# Altium footprint library ICs.PcbLib: 31 footprints (part 1 of 2)
Each footprint in its own frame and in the unit in brackets; x right, y up, seen from the top. Pads: shape width x height; smd on the part's side, far side on the other; paste and mask are expansions set on the pad; w line width, h text height; cw(c..) or ccw(c..) is an arc to the next point about the centre after c.
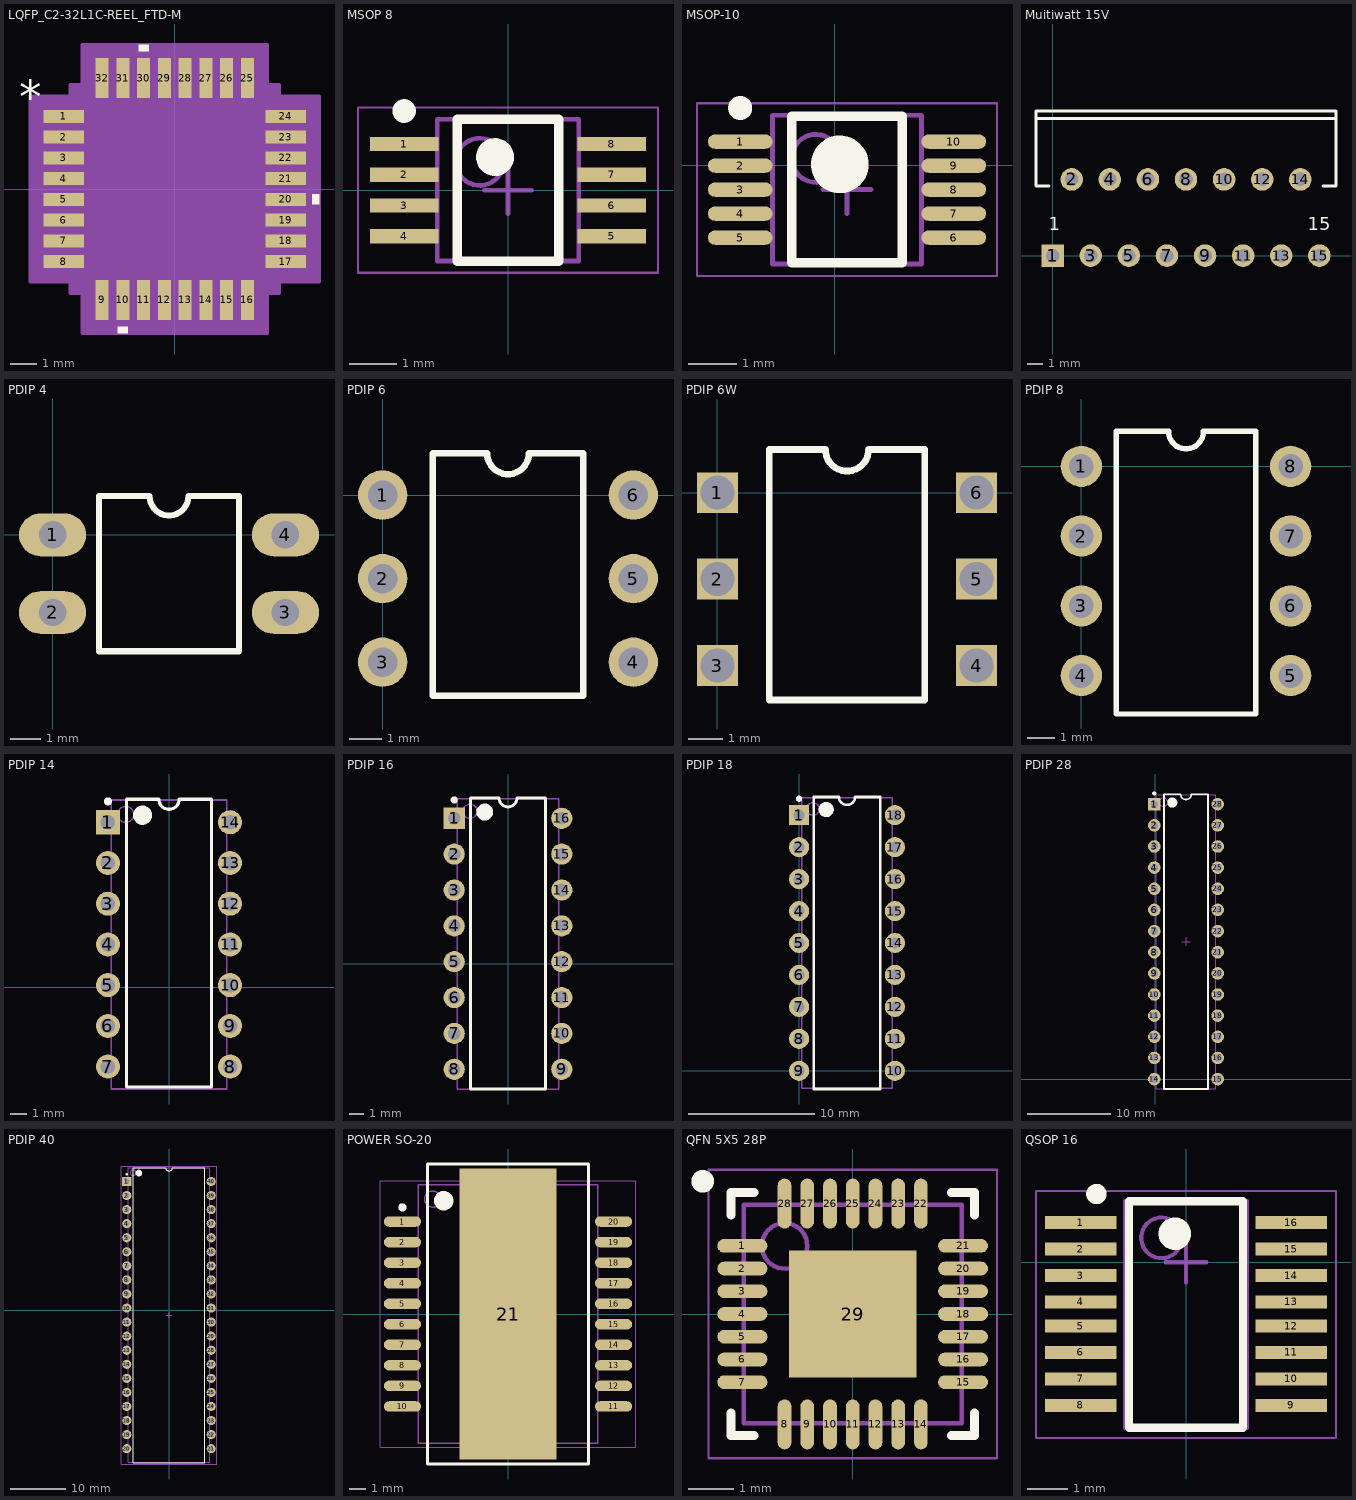
[diagram p0: the footprints below, top view; thin cyan lines are the x and y axes]

## LQFP_C2-32L1C-REEL_FTD-M [mil]
pads (32):
  rect 61x20 smd paste+0 mask+0: 1(-168.5,110.24) 2(-168.5,78.74) 3(-168.5,47.24) 4(-168.5,15.75) 5(-168.5,-15.75) 6(-168.5,-47.24) 7(-168.5,-78.74) 8(-168.5,-110.24) 17(168.5,-110.24) 18(168.5,-78.74) 19(168.5,-47.24) 20(168.5,-15.75) 21(168.5,15.75) 22(168.5,47.24) 23(168.5,78.74) 24(168.5,110.24)
  rect 20x61 smd paste+0 mask+0: 9(-110.24,-168.5) 10(-78.74,-168.5) 11(-47.24,-168.5) 12(-15.75,-168.5) 13(15.75,-168.5) 14(47.24,-168.5) 15(78.74,-168.5) 16(110.24,-168.5) 25(110.24,168.5) 26(78.74,168.5) 27(47.24,168.5) 28(15.75,168.5) 29(-15.75,168.5) 30(-47.24,168.5) 31(-78.74,168.5) 32(-110.24,168.5)
Top Overlay:
  region: -71.24,-209 -86.24,-209 -86.24,-219 -71.24,-219
  region: 209,-8.25 219,-8.25 219,-23.25 209,-23.25
  region: -39.74,209 -54.74,209 -54.74,219 -39.74,219
  text "*" at -236.5,115.98 h50
Mechanical 13:
  lines w1: -138,88 -88,138 ; -177,-119.24 -177,-101.24 -138,-101.24 -138,-119.24 -177,-119.24 ; -177,-87.74 -177,-69.74 -138,-69.74 -138,-87.74 -177,-87.74 ; -177,-56.24 -177,-38.24 -138,-38.24 -138,-56.24 -177,-56.24 ; -177,-24.75 -177,-6.75 -138,-6.75 -138,-24.75 -177,-24.75 ; -177,6.75 -177,24.75 -138,24.75 -138,6.75 -177,6.75 ; -177,38.24 -177,56.24 -138,56.24 -138,38.24 -177,38.24 ; -177,69.74 -177,87.74 -138,87.74 -138,69.74 -177,69.74 ; -177,101.24 -177,119.24 -138,119.24 -138,101.24 -177,101.24 ; -138,-138 -138,138 138,138 138,-138 -138,-138 ; -119.24,-177 -119.24,-138 -101.24,-138 -101.24,-177 -119.24,-177 ; -119.24,138 -101.24,138 -101.24,177 -119.24,177 -119.24,138 ; -87.74,-177 -87.74,-138 -69.74,-138 -69.74,-177 -87.74,-177 ; -87.74,138 -69.74,138 -69.74,177 -87.74,177 -87.74,138 ; -56.24,-177 -56.24,-138 -38.24,-138 -38.24,-177 -56.24,-177 ; -56.24,138 -38.24,138 -38.24,177 -56.24,177 -56.24,138 ; -24.75,-177 -24.75,-138 -6.75,-138 -6.75,-177 -24.75,-177 ; -24.75,138 -6.75,138 -6.75,177 -24.75,177 -24.75,138 ; 6.75,-177 6.75,-138 24.75,-138 24.75,-177 6.75,-177 ; 6.75,138 24.75,138 24.75,177 6.75,177 6.75,138 ; 38.24,-177 38.24,-138 56.24,-138 56.24,-177 38.24,-177 ; 38.24,138 56.24,138 56.24,177 38.24,177 38.24,138 ; 69.74,-177 69.74,-138 87.74,-138 87.74,-177 69.74,-177 ; 69.74,138 87.74,138 87.74,177 69.74,177 69.74,138 ; 101.24,-177 101.24,-138 119.24,-138 119.24,-177 101.24,-177 ; 101.24,138 119.24,138 119.24,177 101.24,177 101.24,138 ; 138,-119.24 138,-101.24 177,-101.24 177,-119.24 138,-119.24 ; 138,-87.74 138,-69.74 177,-69.74 177,-87.74 138,-87.74 ; 138,-56.24 138,-38.24 177,-38.24 177,-56.24 138,-56.24 ; 138,-24.75 138,-6.75 177,-6.75 177,-24.75 138,-24.75 ; 138,6.75 138,24.75 177,24.75 177,6.75 138,6.75 ; 138,38.24 138,56.24 177,56.24 177,38.24 138,38.24 ; 138,69.74 138,87.74 177,87.74 177,69.74 138,69.74 ; 138,101.24 138,119.24 177,119.24 177,101.24 138,101.24
  text "*" at -135.5,100.98 h50
Mechanical 15:
  region: -140.24,-158 -158,-158 -158,-140.24 -219,-140.24 -219,140.24 -158,140.24 -158,158 -140.24,158 -140.24,219 140.24,219 140.24,158 158,158 158,140.24 219,140.24 219,-140.24 158,-140.24 158,-158 140.24,-158 140.24,-219 -140.24,-219
  lines w6: -219,-140.24 -158,-140.24 -158,-158 -140.24,-158 -140.24,-219 140.24,-219 140.24,-158 158,-158 158,-140.24 219,-140.24 219,140.24 158,140.24 158,158 140.24,158 140.24,219 -140.24,219 -140.24,158 -158,158 -158,140.24 -219,140.24 -219,-140.24
3D body "LQFP_C2-32L1C-REEL_FTD.step": height 63.11, standoff 0, extent -177.01,-177.01 177.01,177.01

## MSOP 8 [mm]
height 2
pads (8):
  rect 1.45x0.3 smd: 1(-2.2,0.975) 2(-2.2,0.325) 3(-2.2,-0.325) 4(-2.2,-0.975) 5(2.2,-0.975) 6(2.2,-0.325) 7(2.2,0.325) 8(2.2,0.975)
Top Overlay:
  circle w0.25: c-2.2,1.675 r0.125
  circle w0.4: c-0.275,0.7 r0.2
  lines w0.2: -1.075,-1.5 -1.075,1.5 1.075,1.5 1.075,-1.5 -1.075,-1.5
Mechanical 13:
  circle w0.1: c-0.6,0.6 r0.5
  lines w0.1: -1.5,-1.5 -1.5,1.5 1.5,1.5 1.5,-1.5 -1.5,-1.5
Mechanical 15:
  lines w0.05: -3.175,-1.75 -3.175,1.75 3.175,1.75 3.175,-1.75 -3.175,-1.75
  lines w0.1: -0.5,0 0.5,0 ; 0,-0.5 0,0.5
3D body "MSOP-8 Natl Semi MUY08A.step": height 1.09, standoff -0.01, extent -2.5,-1.524 2.5,1.476

## MSOP-10 [mm] "TSSOP, 10-Leads, Body 3.00x3.05mm, Pitch 0.50mm, IPC Medium Density"
pads (10):
  oval 1.35x0.3 smd: 1(-1.971,0.492) 2(-1.971,-0.008) 3(-1.971,-0.508) 4(-1.971,-1.008) 5(-1.971,-1.508) 6(2.479,-1.508) 7(2.479,-1.008) 8(2.479,-0.508) 9(2.479,-0.008) 10(2.479,0.492)
Top Overlay:
  circle w0.6: c0.104,0.017 r0.3
  circle w0.25: c-1.971,1.192 r0.125
  lines w0.2: -0.896,-2.033 1.404,-2.033 1.404,1.017 -0.896,1.017 -0.896,-2.033
Mechanical 13:
  circle w0.1: c-0.396,0.142 r0.5
  lines w0.1: -1.296,-2.058 1.804,-2.058 1.804,1.042 -1.296,1.042 -1.296,-2.058
Mechanical 15:
  lines w0.05: -2.871,-2.308 3.379,-2.308 3.379,1.292 -2.871,1.292 -2.871,-2.308
  lines w0.1: -0.246,-0.508 0.754,-0.508 ; 0.254,-1.008 0.254,-0.008
3D body "MSOP-10.step": height 1.1, standoff 0, extent -2.196,-2.058 2.704,1.042

## Muitiwatt 15V [mm] "Power Multiwatt"
pads (15):
  rect 1.5x1.5 hole 0.9: 1(0,0)
  round 1.5 hole 0.9: 2(1.27,5.08) 3(2.54,0) 4(3.81,5.08) 5(5.08,0) 6(6.35,5.08) 7(7.62,0) 8(8.89,5.08) 9(10.16,0) 10(11.43,5.08) 11(12.7,0) 12(13.97,5.08) 13(15.24,0) 14(16.51,5.08) 15(17.78,0)
Top Overlay:
  lines w0.2: -1.11,9.13 18.89,9.13 ; -0.254,4.63 -1.11,4.63 -1.11,9.63 18.89,9.63 18.89,4.63 18.034,4.63
  text "15" at 17.018,1.397 h1.5
  text "1" at -0.254,1.397 h1.5
3D body "Multiwatt L298.step": height 20.9, standoff -1.4, extent -0.889,-0.373 18.711,9.517

## PDIP 4 [mm] "IC PDIP 4 PIN"
pads (4):
  oval 2.2x1.4 hole 0.9: 1(0,0) 2(0,-2.54) 3(7.62,-2.54) 4(7.62,0)
Top Overlay:
  lines w0.2: 1.524,-3.81 6.096,-3.81 6.096,1.27 4.445,1.27 cw(c3.81,1.27) 3.175,1.27 1.524,1.27 1.524,-3.81
3D body "PDIP 4.step": height 4.5, standoff -2.5, extent -0.13,-3.565 7.75,1.025

## PDIP 6 [mm] "PDIP 6P"
pads (6):
  round 1.5 hole 0.9: 1(0,0) 2(0,-2.54) 3(0,-5.08) 4(7.62,-5.08) 5(7.62,-2.54) 6(7.62,0)
Top Overlay:
  lines w0.2: 1.524,-6.096 6.096,-6.096 6.096,1.27 4.445,1.27 cw(c3.81,1.27) 3.175,1.27 1.524,1.27 1.524,-6.096
3D body "DIP6-White.STEP": height 5.3, standoff -2, extent -0.125,-6.104 7.745,1.016

## PDIP 6W [mm] "PDIP 6P WHITE"
pads (6):
  rect 1.2x1.2 hole 1: 1(0,0) 2(0,-2.54) 3(0,-5.08) 4(7.62,-5.08) 5(7.62,-2.54) 6(7.62,0)
Top Overlay:
  lines w0.2: 1.524,-6.096 1.524,1.27 3.175,1.27 ccw(c3.81,1.27) 4.445,1.27 6.096,1.27 6.096,-6.096 1.524,-6.096
3D body "DIP6-White.STEP": height 8.3, standoff 1, extent -0.125,-6.104 7.745,1.016
3D body "IC SOCKET 6 PIN.step": height 5.3, standoff -2.7, extent -1.27,-6.223 8.89,1.397

## PDIP 8 [mm] "PDIP 8P IC"
pads (8):
  round 1.5 hole 0.9: 1(0,0) 2(0,-2.54) 3(0,-5.08) 4(0,-7.62) 5(7.62,-7.62) 6(7.62,-5.08) 7(7.62,-2.54) 8(7.62,0)
Top Overlay:
  lines w0.2: 1.27,-9.017 6.35,-9.017 6.35,1.27 4.445,1.27 cw(c3.81,1.27) 3.175,1.27 1.27,1.27 1.27,-9.017
3D body "IC 8 DIP.step": height 8.86, standoff 1.5, extent -0.127,-8.382 7.743,1.018
3D body "IC SOCKET 8 PIN.step": height 5.5, standoff -2.5, extent -1.27,-8.89 8.89,1.27

## PDIP 14 [mm] "PDIP 14 2.54mm Pitch"
pads (14):
  rect 1.5x1.5 hole 0.9: 1(-3.81,10.287)
  round 1.5 hole 0.9: 2(-3.81,7.747) 3(-3.81,5.207) 4(-3.81,2.667) 5(-3.81,0.127) 6(-3.81,-2.413) 7(-3.81,-4.953) 8(3.81,-4.953) 9(3.81,-2.413) 10(3.81,0.127) 11(3.81,2.667) 12(3.81,5.207) 13(3.81,7.747) 14(3.81,10.287)
Top Overlay:
  circle w0.25: c-3.81,11.587 r0.125
  circle w0.6: c-1.65,10.727 r0.3
  lines w0.2: -2.65,-6.223 -2.65,11.727 -0.635,11.727 ccw(c0,11.727) 0.635,11.727 2.65,11.727 2.65,-6.223 -2.65,-6.223
Mechanical 13:
  circle w0.1: c-2.7,10.777 r0.5
  lines w0.1: -3.6,-6.35 -3.6,11.677 3.6,11.677 3.6,-6.35 -3.6,-6.35
3D body "DIP-14 N.step": height 7.1, standoff -0.25, extent -4.445,-6.083 4.692,11.417
3D body "IC SOCKET 14 PIN.step": height 4.7, standoff -3.3, extent -4.953,-6.223 5.207,11.557

## PDIP 16 [mm] "PDIP 16 2.54mm Pitch"
pads (16):
  rect 1.5x1.5 hole 0.9: 1(-3.81,10.287)
  round 1.5 hole 0.9: 2(-3.81,7.747) 3(-3.81,5.207) 4(-3.81,2.667) 5(-3.81,0.127) 6(-3.81,-2.413) 7(-3.81,-4.953) 8(-3.81,-7.493) 9(3.81,-7.493) 10(3.81,-4.953) 11(3.81,-2.413) 12(3.81,0.127) 13(3.81,2.667) 14(3.81,5.207) 15(3.81,7.747) 16(3.81,10.287)
Top Overlay:
  circle w0.25: c-3.81,11.587 r0.125
  circle w0.6: c-1.65,10.727 r0.3
  lines w0.2: -2.65,-8.89 -2.65,11.727 -0.635,11.727 ccw(c0,11.727) 0.635,11.727 2.65,11.727 2.65,-8.89 -2.65,-8.89
Mechanical 13:
  circle w0.1: c-2.7,10.777 r0.5
  lines w0.1: -3.6,-8.89 -3.6,11.677 3.6,11.677 3.6,-8.89 -3.6,-8.89
3D body "Socket IC 16P.step": height 5.5, standoff -2.5, extent -5.08,-8.763 5.08,11.557
3D body "DIP16.step": height 8.89, standoff 2.13, extent -4.064,-9.398 3.81,12.192

## PDIP 18 [mm] "IC PDIP 18"
pads (18):
  rect 1.6x1.6 hole 0.9: 1(0,20.32)
  round 1.6 hole 0.9: 2(0,17.78) 3(0,15.24) 4(0,12.7) 5(0,10.16) 6(0,7.62) 7(0,5.08) 8(0,2.54) 9(0,0) 10(7.62,0) 11(7.62,2.54) 12(7.62,5.08) 13(7.62,7.62) 14(7.62,10.16) 15(7.62,12.7) 16(7.62,15.24) 17(7.62,17.78) 18(7.62,20.32)
Top Overlay:
  circle w0.25: c0,21.62 r0.125
  circle w0.6: c2.16,20.76 r0.3
  lines w0.2: 1.16,-1.44 1.16,21.76 3.175,21.76 ccw(c3.81,21.76) 4.445,21.76 6.46,21.76 6.46,-1.44 1.16,-1.44
Mechanical 13:
  circle w0.1: c1.11,20.81 r0.5
  lines w0.1: 0.21,-1.39 0.21,21.71 7.41,21.71 7.41,-1.39 0.21,-1.39
3D body "IC SOCKET DIP 18.step": height 5.2, standoff -2.8, extent -1.27,-1.27 8.89,21.59
3D body "DIP18-1.STEP": height 8.57, standoff 0.19, extent -0.227,-1.333 7.593,21.907

## PDIP 28 [mm] "PDIP 28 Through Hole"
pads (28):
  rect 1.5x1.5 hole 0.9: 1(-0.127,33.02)
  round 1.5 hole 0.9: 2(-0.127,30.48) 3(-0.127,27.94) 4(-0.127,25.4) 5(-0.127,22.86) 6(-0.127,20.32) 7(-0.127,17.78) 8(-0.127,15.24) 9(-0.127,12.7) 10(-0.127,10.16) 11(-0.127,7.62) 12(-0.127,5.08) 13(-0.127,2.54) 14(-0.127,0) 15(7.493,0) 16(7.493,2.54) 17(7.493,5.08) 18(7.493,7.62) 19(7.493,10.16) 20(7.493,12.7) 21(7.493,15.24) 22(7.493,17.78) 23(7.493,20.32) 24(7.493,22.86) 25(7.493,25.4) 26(7.493,27.94) 27(7.493,30.48) 28(7.493,33.02)
Top Overlay:
  circle w0.6: c2.033,33.21 r0.3
  circle w0.25: c-0.127,34.32 r0.125
  lines w0.2: 1.033,-1.19 6.333,-1.19 6.333,34.21 4.318,34.21 cw(c3.683,34.21) 3.048,34.21 1.033,34.21 1.033,-1.19
Mechanical 13:
  circle w0.1: c0.983,33.26 r0.5
  lines w0.1: 0.083,-1.14 7.283,-1.14 7.283,34.16 0.083,34.16 0.083,-1.14
Mechanical 15:
  lines w0.1: 3.183,16.51 4.183,16.51 ; 3.683,16.01 3.683,17.01
3D body "28PDIP.step": height 4.65, standoff -1.57, extent -0.254,-1.461 7.62,34.481

## PDIP 40 [mm] "PDIP 40 IC Socket"
pads (40):
  rect 1.65x1.65 hole 0.9: 1(-7.62,23.241)
  round 1.65 hole 0.9: 2(-7.62,20.701) 3(-7.62,18.161) 4(-7.62,15.621) 5(-7.62,13.081) 6(-7.62,10.541) 7(-7.62,8.001) 8(-7.62,5.461) 9(-7.62,2.921) 10(-7.62,0.381) 11(-7.62,-2.159) 12(-7.62,-4.699) 13(-7.62,-7.239) 14(-7.62,-9.779) 15(-7.62,-12.319) 16(-7.62,-14.859) 17(-7.62,-17.399) 18(-7.62,-19.939) 19(-7.62,-22.479) 20(-7.62,-25.019) 21(7.62,-25.019) 22(7.62,-22.479) 23(7.62,-19.939) 24(7.62,-17.399) 25(7.62,-14.859) 26(7.62,-12.319) 27(7.62,-9.779) 28(7.62,-7.239) 29(7.62,-4.699) 30(7.62,-2.159) 31(7.62,0.381) 32(7.62,2.921) 33(7.62,5.461) 34(7.62,8.001) 35(7.62,10.541) 36(7.62,13.081) 37(7.62,15.621) 38(7.62,18.161) 39(7.62,20.701) 40(7.62,23.241)
Top Overlay:
  circle w0.6: c-5.45,24.761 r0.3
  circle w0.25: c-7.62,24.541 r0.125
  lines w0.2: -6.45,-27.539 6.45,-27.539 6.45,25.761 0.635,25.761 cw(c0,25.761) -0.635,25.761 -6.45,25.761 -6.45,-27.539
Mechanical 13:
  circle w0.1: c-6.475,24.811 r0.5
  lines w0.1: -7.375,-27.489 7.375,-27.489 7.375,25.711 -7.375,25.711 -7.375,-27.489
Mechanical 15:
  lines w0.05: -8.65,-27.789 8.65,-27.789 8.65,26.011 -8.65,26.011 -8.65,-27.789
  lines w0.1: -0.5,-0.889 0.5,-0.889 ; 0,-1.389 0,-0.389
3D body "40 PDIP SOCKET.STEP": height 4.47, standoff -2.9, extent -8.85,-26.289 8.85,24.511
3D body: height 0, standoff -1.6, extent 7.485,22.881 7.755,23.601
3D body: height 3.51, standoff 3.23, extent 7.375,22.741 7.755,23.741
3D body: height 3.24, standoff 0, extent 7.485,22.741 7.755,23.741
3D body: height 0, standoff -1.6, extent 7.485,20.341 7.755,21.061
3D body: height 3.51, standoff 3.23, extent 7.375,20.201 7.755,21.201
3D body: height 3.24, standoff 0, extent 7.485,20.201 7.755,21.201
3D body: height 0, standoff -1.6, extent 7.485,17.801 7.755,18.521
3D body: height 3.51, standoff 3.23, extent 7.375,17.661 7.755,18.661
3D body: height 3.24, standoff 0, extent 7.485,17.661 7.755,18.661
3D body: height 0, standoff -1.6, extent 7.485,15.261 7.755,15.981
3D body: height 3.51, standoff 3.23, extent 7.375,15.121 7.755,16.121
3D body: height 3.24, standoff 0, extent 7.485,15.121 7.755,16.121
3D body: height 0, standoff -1.6, extent 7.485,12.721 7.755,13.441
3D body: height 3.51, standoff 3.23, extent 7.375,12.581 7.755,13.581
3D body: height 3.24, standoff 0, extent 7.485,12.581 7.755,13.581
3D body: height 0, standoff -1.6, extent 7.485,10.181 7.755,10.901
3D body: height 3.51, standoff 3.23, extent 7.375,10.041 7.755,11.041
3D body: height 3.24, standoff 0, extent 7.485,10.041 7.755,11.041
3D body: height 0, standoff -1.6, extent 7.485,7.641 7.755,8.361
3D body: height 3.51, standoff 3.23, extent 7.375,7.501 7.755,8.501
3D body: height 3.24, standoff 0, extent 7.485,7.501 7.755,8.501
3D body: height 0, standoff -1.6, extent 7.485,5.101 7.755,5.821
3D body: height 3.51, standoff 3.23, extent 7.375,4.961 7.755,5.961
3D body: height 3.24, standoff 0, extent 7.485,4.961 7.755,5.961
3D body: height 0, standoff -1.6, extent 7.485,2.561 7.755,3.281
3D body: height 3.51, standoff 3.23, extent 7.375,2.421 7.755,3.421
3D body: height 3.24, standoff 0, extent 7.485,2.421 7.755,3.421
3D body: height 0, standoff -1.6, extent 7.485,0.021 7.755,0.741
3D body: height 3.51, standoff 3.23, extent 7.375,-0.119 7.755,0.881
3D body: height 3.24, standoff 0, extent 7.485,-0.119 7.755,0.881
3D body: height 0, standoff -1.6, extent 7.485,-2.519 7.755,-1.799
3D body: height 3.51, standoff 3.23, extent 7.375,-2.659 7.755,-1.659
3D body: height 3.24, standoff 0, extent 7.485,-2.659 7.755,-1.659
3D body: height 0, standoff -1.6, extent 7.485,-5.059 7.755,-4.339
3D body: height 3.51, standoff 3.23, extent 7.375,-5.199 7.755,-4.199
3D body: height 3.24, standoff 0, extent 7.485,-5.199 7.755,-4.199
3D body: height 0, standoff -1.6, extent 7.485,-7.599 7.755,-6.879
3D body: height 3.51, standoff 3.23, extent 7.375,-7.739 7.755,-6.739
3D body: height 3.24, standoff 0, extent 7.485,-7.739 7.755,-6.739
3D body: height 0, standoff -1.6, extent 7.485,-10.139 7.755,-9.419
3D body: height 3.51, standoff 3.23, extent 7.375,-10.279 7.755,-9.279
3D body: height 3.24, standoff 0, extent 7.485,-10.279 7.755,-9.279
3D body: height 0, standoff -1.6, extent 7.485,-12.679 7.755,-11.959
3D body: height 3.51, standoff 3.23, extent 7.375,-12.819 7.755,-11.819
3D body: height 3.24, standoff 0, extent 7.485,-12.819 7.755,-11.819
3D body: height 0, standoff -1.6, extent 7.485,-15.219 7.755,-14.499
3D body: height 3.51, standoff 3.23, extent 7.375,-15.359 7.755,-14.359
3D body: height 3.24, standoff 0, extent 7.485,-15.359 7.755,-14.359
3D body: height 0, standoff -1.6, extent 7.485,-17.759 7.755,-17.039
3D body: height 3.51, standoff 3.23, extent 7.375,-17.899 7.755,-16.899
3D body: height 3.24, standoff 0, extent 7.485,-17.899 7.755,-16.899
3D body: height 0, standoff -1.6, extent 7.485,-20.299 7.755,-19.579
3D body: height 3.51, standoff 3.23, extent 7.375,-20.439 7.755,-19.439
3D body: height 3.24, standoff 0, extent 7.485,-20.439 7.755,-19.439
3D body: height 0, standoff -1.6, extent 7.485,-22.839 7.755,-22.119
3D body: height 3.51, standoff 3.23, extent 7.375,-22.979 7.755,-21.979
3D body: height 3.24, standoff 0, extent 7.485,-22.979 7.755,-21.979
3D body: height 0, standoff -1.6, extent 7.485,-25.379 7.755,-24.659
3D body: height 3.51, standoff 3.23, extent 7.375,-25.519 7.755,-24.519
3D body: height 3.24, standoff 0, extent 7.485,-25.519 7.755,-24.519
3D body: height 0, standoff -1.6, extent -7.755,-25.379 -7.485,-24.659
3D body: height 3.51, standoff 3.23, extent -7.755,-25.519 -7.375,-24.519
3D body: height 3.24, standoff 0, extent -7.755,-25.519 -7.485,-24.519
3D body: height 0, standoff -1.6, extent -7.755,-22.839 -7.485,-22.119
3D body: height 3.51, standoff 3.23, extent -7.755,-22.979 -7.375,-21.979
3D body: height 3.24, standoff 0, extent -7.755,-22.979 -7.485,-21.979
3D body: height 0, standoff -1.6, extent -7.755,-20.299 -7.485,-19.579
3D body: height 3.51, standoff 3.23, extent -7.755,-20.439 -7.375,-19.439
3D body: height 3.24, standoff 0, extent -7.755,-20.439 -7.485,-19.439
3D body: height 0, standoff -1.6, extent -7.755,-17.759 -7.485,-17.039
3D body: height 3.51, standoff 3.23, extent -7.755,-17.899 -7.375,-16.899
3D body: height 3.24, standoff 0, extent -7.755,-17.899 -7.485,-16.899
3D body: height 0, standoff -1.6, extent -7.755,-15.219 -7.485,-14.499
3D body: height 3.51, standoff 3.23, extent -7.755,-15.359 -7.375,-14.359
3D body: height 3.24, standoff 0, extent -7.755,-15.359 -7.485,-14.359
3D body: height 0, standoff -1.6, extent -7.755,-12.679 -7.485,-11.959
3D body: height 3.51, standoff 3.23, extent -7.755,-12.819 -7.375,-11.819
3D body: height 3.24, standoff 0, extent -7.755,-12.819 -7.485,-11.819
3D body: height 0, standoff -1.6, extent -7.755,-10.139 -7.485,-9.419
3D body: height 3.51, standoff 3.23, extent -7.755,-10.279 -7.375,-9.279
3D body: height 3.24, standoff 0, extent -7.755,-10.279 -7.485,-9.279
3D body: height 0, standoff -1.6, extent -7.755,-7.599 -7.485,-6.879
3D body: height 3.51, standoff 3.23, extent -7.755,-7.739 -7.375,-6.739
3D body: height 3.24, standoff 0, extent -7.755,-7.739 -7.485,-6.739
3D body: height 0, standoff -1.6, extent -7.755,-5.059 -7.485,-4.339
3D body: height 3.51, standoff 3.23, extent -7.755,-5.199 -7.375,-4.199
3D body: height 3.24, standoff 0, extent -7.755,-5.199 -7.485,-4.199
3D body: height 0, standoff -1.6, extent -7.755,-2.519 -7.485,-1.799
3D body: height 3.51, standoff 3.23, extent -7.755,-2.659 -7.375,-1.659
3D body: height 3.24, standoff 0, extent -7.755,-2.659 -7.485,-1.659
3D body: height 0, standoff -1.6, extent -7.755,0.021 -7.485,0.741
3D body: height 3.51, standoff 3.23, extent -7.755,-0.119 -7.375,0.881
3D body: height 3.24, standoff 0, extent -7.755,-0.119 -7.485,0.881
3D body: height 0, standoff -1.6, extent -7.755,2.561 -7.485,3.281
3D body: height 3.51, standoff 3.23, extent -7.755,2.421 -7.375,3.421
3D body: height 3.24, standoff 0, extent -7.755,2.421 -7.485,3.421
3D body: height 0, standoff -1.6, extent -7.755,5.101 -7.485,5.821
3D body: height 3.51, standoff 3.23, extent -7.755,4.961 -7.375,5.961
3D body: height 3.24, standoff 0, extent -7.755,4.961 -7.485,5.961
3D body: height 0, standoff -1.6, extent -7.755,7.641 -7.485,8.361
3D body: height 3.51, standoff 3.23, extent -7.755,7.501 -7.375,8.501
3D body: height 3.24, standoff 0, extent -7.755,7.501 -7.485,8.501
3D body: height 0, standoff -1.6, extent -7.755,10.181 -7.485,10.901
3D body: height 3.51, standoff 3.23, extent -7.755,10.041 -7.375,11.041
3D body: height 3.24, standoff 0, extent -7.755,10.041 -7.485,11.041
3D body: height 0, standoff -1.6, extent -7.755,12.721 -7.485,13.441
3D body: height 3.51, standoff 3.23, extent -7.755,12.581 -7.375,13.581
3D body: height 3.24, standoff 0, extent -7.755,12.581 -7.485,13.581
3D body: height 0, standoff -1.6, extent -7.755,15.261 -7.485,15.981
3D body: height 3.51, standoff 3.23, extent -7.755,15.121 -7.375,16.121
3D body: height 3.24, standoff 0, extent -7.755,15.121 -7.485,16.121
3D body: height 0, standoff -1.6, extent -7.755,17.801 -7.485,18.521
3D body: height 3.51, standoff 3.23, extent -7.755,17.661 -7.375,18.661
3D body: height 3.24, standoff 0, extent -7.755,17.661 -7.485,18.661
3D body: height 0, standoff -1.6, extent -7.755,20.341 -7.485,21.061
3D body: height 3.51, standoff 3.23, extent -7.755,20.201 -7.375,21.201
3D body: height 3.24, standoff 0, extent -7.755,20.201 -7.485,21.201
3D body: height 0, standoff -1.6, extent -7.755,22.881 -7.485,23.601
3D body: height 3.51, standoff 3.23, extent -7.755,22.741 -7.375,23.741
3D body: height 3.24, standoff 0, extent -7.755,22.741 -7.485,23.741
3D body "PDIP-40.step": height 8.96, standoff 1.6, extent -7.765,-27.051 7.765,25.209

## POWER SO-20 [mm] "SOP, 20-Leads, Body 15.90x11.00mm, Pitch 1.27mm, Thermal Pad 9.80.2x6.20.2mm, IPC Medium Density"
height 2.65
pads (21):
  oval 2.3x0.65 smd: 1(-6.525,5.715) 2(-6.525,4.445) 3(-6.525,3.175) 4(-6.525,1.905) 5(-6.525,0.635) 6(-6.525,-0.635) 7(-6.525,-1.905) 8(-6.525,-3.175) 9(-6.525,-4.445) 10(-6.525,-5.715) 11(6.525,-5.715) 12(6.525,-4.445) 13(6.525,-3.175) 14(6.525,-1.905) 15(6.525,-0.635) 16(6.525,0.635) 17(6.525,1.905) 18(6.525,3.175) 19(6.525,4.445) 20(6.525,5.715)
  rect 6x18 smd: 21(0,0)
Top Overlay:
  circle w0.6: c-3.975,7 r0.3
  circle w0.25: c-6.525,6.59 r0.125
  lines w0.2: -4.975,-9.271 4.975,-9.271 4.975,9.271 -4.975,9.271 -4.975,-9.271
Mechanical 13:
  circle w0.1: c-4.65,7.1 r0.5
  lines w0.1: -5.55,-8 5.55,-8 5.55,8 -5.55,8 -5.55,-8
Mechanical 15:
  lines w0.05: -7.9,-8.25 7.9,-8.25 7.9,8.25 -7.9,8.25 -7.9,-8.25
  lines w0.1: -0.5,0 0.5,0 ; 0,-0.5 0,0.5
3D body "User Library-PowerSO20.STEP": height 3.6, standoff 0, extent -7.034,-8 7.366,8

## QFN 5X5 28P [mm] "QFN, 28-Leads, Body 4.80x4.80mm, Pitch 0.50mm, Thermal Pad 2.90x2.90mm, IPC Medium Density"
height 0.9
pads (29):
  oval 1.1x0.3 smd: 1(-2.429,1.5) 2(-2.429,1) 3(-2.429,0.5) 4(-2.429,0) 5(-2.429,-0.5) 6(-2.429,-1) 7(-2.429,-1.5) 15(2.429,-1.5) 16(2.429,-1) 17(2.429,-0.5) 18(2.429,0) 19(2.429,0.5) 20(2.429,1) 21(2.429,1.5)
  oval 0.3x1.1 smd: 8(-1.5,-2.429) 9(-1,-2.429) 10(-0.5,-2.429) 11(0,-2.429) 12(0.5,-2.429) 13(1,-2.429) 14(1.5,-2.429) 22(1.5,2.429) 23(1,2.429) 24(0.5,2.429) 25(0,2.429) 26(-0.5,2.429) 27(-1,2.429) 28(-1.5,2.429)
  rect 2.8x2.8 smd: 29(0,0)
Top Overlay:
  circle w0.25: c-3.302,2.921 r0.125
  lines w0.2: -2.677,-2.177 -2.677,-2.677 -2.177,-2.677 ; -2.677,2.177 -2.677,2.677 -2.177,2.677 ; 2.177,-2.677 2.677,-2.677 2.677,-2.177 ; 2.177,2.677 2.677,2.677 2.677,2.177
Mechanical 13:
  circle w0.1: c-1.5,1.5 r0.5
  lines w0.1: -2.4,-2.4 -2.4,2.4 2.4,2.4 2.4,-2.4 -2.4,-2.4
Mechanical 15:
  lines w0.05: -3.175,-3.175 -3.175,3.175 3.175,3.175 3.175,-3.175 -3.175,-3.175
  lines w0.1: -0.5,0 0.5,0 ; 0,-0.5 0,0.5
3D body "QFN 5X5 28P.step": height 0.9, standoff 0, extent -2.41,-2.41 2.41,2.41

## QSOP 16 [mm] "QSOP 16 SMT"
pads (16):
  rect 1.75x0.325 smd: 1(-2.581,0.975) 2(-2.581,0.325) 3(-2.581,-0.325) 4(-2.581,-0.975) 5(-2.581,-1.565) 6(-2.581,-2.215) 7(-2.581,-2.865) 8(-2.581,-3.515) 9(2.581,-3.515) 10(2.581,-2.865) 11(2.581,-2.215) 12(2.581,-1.565) 13(2.581,-0.975) 14(2.581,-0.325) 15(2.581,0.325) 16(2.581,0.975)
Top Overlay:
  circle w0.4: c-0.275,0.7 r0.2
  circle w0.25: c-2.2,1.675 r0.125
  lines w0.2: -1.397,-4.064 1.397,-4.064 1.397,1.5 -1.397,1.5 -1.397,-4.064
Mechanical 13:
  circle w0.1: c-0.6,0.6 r0.5
  lines w0.1: -1.5,-4.064 1.5,-4.064 1.5,1.5 -1.5,1.5 -1.5,-4.064
Mechanical 15:
  lines w0.05: -3.683,-4.318 3.683,-4.318 3.683,1.75 -3.683,1.75 -3.683,-4.318
  lines w0.1: -0.5,0 0.5,0 ; 0,-0.5 0,0.5
3D body "QSOP16.step": height 3.12, standoff 0.03, extent -3.01,-3.715 3.01,1.175